# Altium footprint library MARCS Footprints.PcbLib: 53 footprints (part 3 of 4)
Each footprint in its own frame and in the unit in brackets; x right, y up, seen from the top. Pads: shape width x height; smd on the part's side, far side on the other; paste and mask are expansions set on the pad; w line width, h text height; cw(c..) or ccw(c..) is an arc to the next point about the centre after c.
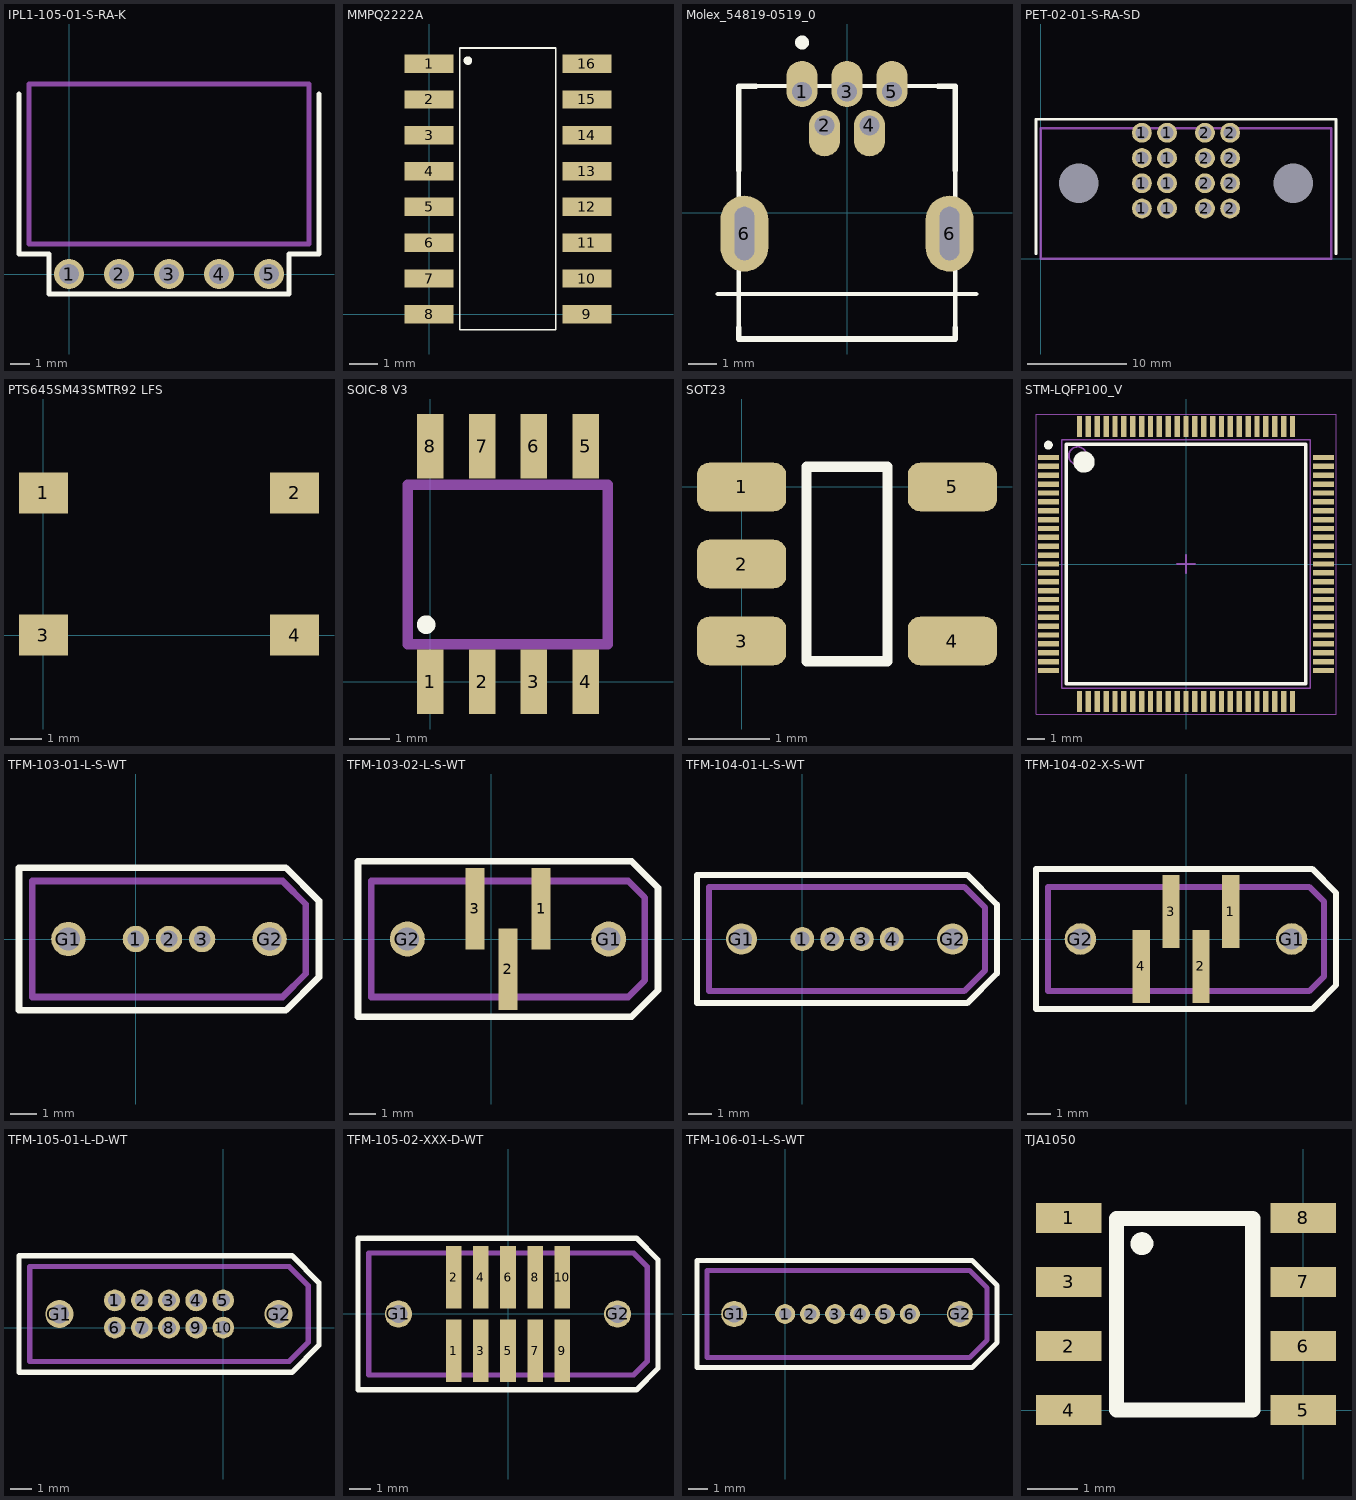
[diagram p2: the footprints below, top view; thin cyan lines are the x and y axes]

## IPL1-105-01-S-RA-K [mil]
pads (5):
  round 60 hole 40 mask+3: 1(0,0) 2(100,0) 3(200,0) 4(300,0) 5(400,0)
Top Overlay:
  lines w10: -100,360 -100,40 -40,40 -40,-40 440,-40 440,40 500,40 500,360
Mechanical 1:
  lines w10: 479,380 -80,380 -80,60 480,60 480,380
3D body "IPL1-105-01-F-S-RA-K.stp": height 277.8, standoff -67.2, extent -79.21,-11.47 480.79,381.03

## MMPQ2222A [mm] "BJT NPN Quad Transistor"
pads (16):
  rect 1.75x0.65 smd: 1(0,8.89) 2(0,7.62) 3(0,6.35) 4(0,5.08) 5(0,3.81) 6(0,2.54) 7(0,1.27) 8(0,0) 9(5.6,0) 10(5.6,1.27) 11(5.6,2.54) 12(5.6,3.81) 13(5.6,5.08) 14(5.6,6.35) 15(5.6,7.62) 16(5.6,8.89)
Top Overlay:
  circle w0.254: c1.375,9 r0.025
  lines w0.064: 1.092,-0.55 4.496,-0.55 4.496,9.45 1.092,9.45 1.092,-0.55
3D body "User Library-SOIC-16-1.SLDPRT": height 1.4, standoff 0, extent -0.2,-0.5 5.8,9.4

## Molex_54819-0519_0 [mm]
pads (7):
  oval 1.1x1.65 hole 0.7 copper offset 0,0.275: 1(-1.6,4.3) 3(0,4.3) 5(1.6,4.3)
  oval 1.1x1.65 hole 0.7 copper offset 0,-0.275: 2(-0.8,3.1) 4(0.8,3.1)
  oval 1.7x2.7 hole 1.9 slot 0.7 at 0 deg paste-1000 mask+0: 6(-3.65,-0.75) 6(3.65,-0.75)
Top Overlay:
  circle w0.25: c-1.6,6.05 r0.125
  lines w0.15: -4.6,-2.9 4.6,-2.9 ; -3.85,-4.5 3.85,-4.5 3.85,4.5 -3.85,4.5 -3.85,-4.5
  lines w0.2: -3.85,-4.1 -3.85,-4.5 3.85,-4.5 3.85,-4.1 ; -3.85,1.5 -3.85,4.5 -3.25,4.5 ; 3.25,4.5 3.85,4.5 3.85,1.5
3D body "3dmodel.step": height 3.98, standoff -1.77, extent -3.85,-4.499 3.85,4.501

## PET-02-01-S-RA-SD [mm]
pads (18):
  round 2 hole 1.32 mask+0.075: 1(10.16,5.08) 1(10.16,7.62) 1(10.16,10.16) 1(10.16,12.7) 1(12.7,5.08) 1(12.7,7.62) 1(12.7,10.16) 1(12.7,12.7) 2(16.51,5.08) 2(16.51,7.62) 2(16.51,10.16) 2(16.51,12.7) 2(19.05,5.08) 2(19.05,7.62) 2(19.05,10.16) 2(19.05,12.7)
  round 0 hole 4.01 unplated: G1(3.81,7.62) G2(25.4,7.62)
Top Overlay:
  lines w0.254: -0.5,0.5 -0.5,14.08 29.7,14.08 ; 29.71,0.5 29.71,14.08
Mechanical 1:
  lines w0.254: 0,0 0,13.14 29.21,13.14 29.21,0 0,0

## PTS645SM43SMTR92 LFS [mm] "SMD Button"
pads (4):
  rect 1.55x1.3 smd: 1(0,4.5) 2(7.95,4.5) 3(0,0) 4(7.95,0)
3D body "PTS645SM43SMTR92LFS.sldprt": height 4.3, standoff 0, extent -0.537,-0.739 8.463,5.261

## SOIC-8 V3 [mm]
pads (8):
  rect 0.65x1.575 smd: 1(0,0) 2(1.27,0) 3(2.54,0) 4(3.81,0) 5(3.81,5.775) 6(2.54,5.775) 7(1.27,5.775) 8(0,5.775)
Top Overlay:
  circle w0.254: c-0.1,1.4 r0.1
Mechanical 1:
  lines w0.254: -0.55,0.925 4.35,0.925 4.35,4.825 -0.55,4.825 -0.55,0.925
3D body "8SIOC.stp": height 1.88, standoff -0.07, extent -0.597,-0.178 4.407,6.02

## SOT23 [mm]
pads (5):
  rrect50% 1.1x0.6 smd: 1(0,0) 2(0,-0.95) 3(0,-1.9) 4(2.6,-1.9) 5(2.6,0)
Top Overlay:
  lines w0.127: 0.8,-2.15 0.8,0.25 1.8,0.25 1.8,-2.15 0.8,-2.15
3D body "DBV0005A.stp": height 1.2, standoff 0, extent -0.1,-2.4 2.7,0.5

## STM-LQFP100_V [mm] "Thin QFP, 100-Leads, Body 14x14mm, Pitch 0.5mm, ST Recommended"
height 1.6
pads (100):
  rect 1.2x0.3 smd: 1(-7.75,6) 2(-7.75,5.5) 3(-7.75,5) 4(-7.75,4.5) 5(-7.75,4) 6(-7.75,3.5) 7(-7.75,3) 8(-7.75,2.5) 9(-7.75,2) 10(-7.75,1.5) 11(-7.75,1) 12(-7.75,0.5) 13(-7.75,0) 14(-7.75,-0.5) 15(-7.75,-1) 16(-7.75,-1.5) 17(-7.75,-2) 18(-7.75,-2.5) 19(-7.75,-3) 20(-7.75,-3.5) 21(-7.75,-4) 22(-7.75,-4.5) 23(-7.75,-5) 24(-7.75,-5.5) 25(-7.75,-6) 51(7.75,-6) 52(7.75,-5.5) 53(7.75,-5) 54(7.75,-4.5) 55(7.75,-4) 56(7.75,-3.5) 57(7.75,-3) 58(7.75,-2.5) 59(7.75,-2) 60(7.75,-1.5) 61(7.75,-1) 62(7.75,-0.5) 63(7.75,0) 64(7.75,0.5) 65(7.75,1) 66(7.75,1.5) 67(7.75,2) 68(7.75,2.5) 69(7.75,3) 70(7.75,3.5) 71(7.75,4) 72(7.75,4.5) 73(7.75,5) 74(7.75,5.5) 75(7.75,6)
  rect 0.3x1.2 smd: 26(-6,-7.75) 27(-5.5,-7.75) 28(-5,-7.75) 29(-4.5,-7.75) 30(-4,-7.75) 31(-3.5,-7.75) 32(-3,-7.75) 33(-2.5,-7.75) 34(-2,-7.75) 35(-1.5,-7.75) 36(-1,-7.75) 37(-0.5,-7.75) 38(0,-7.75) 39(0.5,-7.75) 40(1,-7.75) 41(1.5,-7.75) 42(2,-7.75) 43(2.5,-7.75) 44(3,-7.75) 45(3.5,-7.75) 46(4,-7.75) 47(4.5,-7.75) 48(5,-7.75) 49(5.5,-7.75) 50(6,-7.75) 76(6,7.75) 77(5.5,7.75) 78(5,7.75) 79(4.5,7.75) 80(4,7.75) 81(3.5,7.75) 82(3,7.75) 83(2.5,7.75) 84(2,7.75) 85(1.5,7.75) 86(1,7.75) 87(0.5,7.75) 88(0,7.75) 89(-0.5,7.75) 90(-1,7.75) 91(-1.5,7.75) 92(-2,7.75) 93(-2.5,7.75) 94(-3,7.75) 95(-3.5,7.75) 96(-4,7.75) 97(-4.5,7.75) 98(-5,7.75) 99(-5.5,7.75) 100(-6,7.75)
Top Overlay:
  circle w0.25: c-7.75,6.7 r0.125
  circle w0.6: c-5.75,5.75 r0.3
  lines w0.2: -6.75,-6.75 -6.75,6.75 6.75,6.75 6.75,-6.75 -6.75,-6.75
Mechanical 1:
  circle w0.1: c-6.1,6.1 r0.5
  lines w0.05: -8.45,-8.45 -8.45,8.45 8.45,8.45 8.45,-8.45 -8.45,-8.45
  lines w0.1: -0.5,0 0.5,0 ; 0,-0.5 0,0.5 ; -7,-7 -7,7 7,7 7,-7 -7,-7
3D body: height 1.6, standoff 0.05, extent -7,-7 7,7

## TFM-103-01-L-S-WT [mil]
pads (5):
  round 40 hole 25 mask+3: 1(0,0) 2(50,0) 3(100,0)
  round 52 hole 35 mask+3: G1(-102,0) G2(202,0)
Top Overlay:
  lines w10: -176.5,-107.5 -176.5,107.5 226.5,107.5 276.5,57.5 276.5,-57.5 226.5,-107.5 -176.5,-107.5
Mechanical 1:
  lines w10: -156.5,-87.5 -156.5,87.5 221.5,87.5 256.5,52.5 256.5,-52.5 221.5,-87.5 -156.5,-87.5
3D body "TFM-103-01-L-S-WT.stp": height 220, standoff -93, extent -156.49,-87.5 256.51,87.5

## TFM-103-02-L-S-WT [mil]
pads (5):
  rect 29x123 smd mask+2: 1(75,46) 2(25,-46) 3(-25,46)
  round 53 hole 35 mask+3: G1(177,0) G2(-127,0)
Top Overlay:
  lines w10: -201.5,-117.5 211.5,-117.5 251.5,-77.5 251.5,77.5 211.5,117.5 -201.5,117.5 -201.5,-117.5
Mechanical 1:
  lines w10: -181.5,-87.5 206.5,-87.5 231.5,-62.5 231.5,62.5 206.5,87.5 -181.5,87.5 -181.5,-87.5
  text "J1" at -203,130 h30

## TFM-104-01-L-S-WT [mil]
pads (6):
  round 40 hole 25 mask+3: 1(0,0) 2(50,0) 3(100,0) 4(150,0)
  round 52 hole 35 mask+3: G1(-102,0) G2(252,0)
Top Overlay:
  lines w10: -176.5,-107.5 -176.5,107.5 276.5,107.5 326.5,57.5 326.5,-57.5 276.5,-107.5 -176.5,-107.5
Mechanical 1:
  lines w10: -156.5,-87.5 -156.5,87.5 271.5,87.5 306.5,52.5 306.5,-52.5 271.5,-87.5 -156.5,-87.5
3D body "TFM-104-01-L-S-WT.stp": height 220, standoff -93, extent -156.5,-87.49 306.51,87.51

## TFM-104-02-X-S-WT [mil]
pads (6):
  rect 29x123 smd mask+2: 1(75,46) 2(25,-46) 3(-25,46) 4(-75,-46)
  round 53 hole 35 mask+3: G1(177,0) G2(-177,0)
Top Overlay:
  lines w10: -251.5,-117.5 211.5,-117.5 251.5,-77.5 251.5,77.5 211.5,117.5 -251.5,117.5 -251.5,-117.5
Mechanical 1:
  lines w10: -231.5,-87.5 206.5,-87.5 231.5,-62.5 231.5,62.5 206.5,87.5 -231.5,87.5 -231.5,-87.5
  text "J1" at -19.57,-20 h30

## TFM-105-01-L-D-WT [mil]
pads (12):
  round 40 hole 25 mask+3: 1(-200,50) 2(-150,50) 3(-100,50) 4(-50,50) 5(0,50) 6(-200,0) 7(-150,0) 8(-100,0) 9(-50,0) 10(0,0)
  round 52 hole 35 mask+3: G1(-302,25) G2(102,25)
Top Overlay:
  lines w10: -376.5,-82.5 -376.5,132.5 126.5,132.5 176.5,82.5 176.5,-32.5 126.5,-82.5 -376.5,-82.5
Mechanical 1:
  lines w10: -356.5,-62.5 -356.5,112.5 121.5,112.5 156.5,77.5 156.5,-27.5 121.5,-62.5 -356.5,-62.5
3D body "TFM-105-01-L-D-WT.stp": height 220, standoff -93, extent -356.5,-90 156.5,135

## TFM-105-02-XXX-D-WT [mil]
pads (12):
  rect 29x115 smd mask+2: 1(-100,-67.5) 2(-100,67.5) 3(-50,-67.5) 4(-50,67.5) 5(0,-67.5) 6(0,67.5) 7(50,-67.5) 8(50,67.5) 9(100,-67.5) 10(100,67.5)
  round 50 hole 33 mask+3: G1(-202,0) G2(202,0)
Top Overlay:
  lines w10: -276.5,-140 236.5,-140 276.5,-100 276.5,100 236.5,140 -276.5,140 -276.5,-140
Mechanical 1:
  lines w10: -256.5,-112.5 231.5,-112.5 256.5,-87.5 256.5,87.5 231.5,112.5 -256.5,112.5 -256.5,-112.5
  text "J1" at -19.57,-20 h30

## TFM-106-01-L-S-WT [mil]
pads (8):
  round 40 hole 25 mask+3: 1(0,0) 2(50,0) 3(100,0) 4(150,0) 5(200,0) 6(250,0)
  round 52 hole 35 mask+3: G1(-102,0) G2(350,0)
Top Overlay:
  lines w10: -176.5,-107.5 374.5,-107.5 424.5,-57.5 424.5,57.5 374.5,107.5 -176.5,107.5 -176.5,-107.5
Mechanical 1:
  lines w10: -156.5,-87.5 369.5,-87.5 404.5,-52.5 404.5,52.5 369.5,87.5 -156.5,87.5 -156.5,-87.5
3D body "TFM-106-01-L-S-WT.stp": height 220, standoff -93, extent -156.5,-87.5 406.5,87.5

## TJA1050 [mm] "SOT96"
pads (8):
  rect 1.3x0.6 smd: 1(-4.65,3.81) 2(-4.65,1.27) 3(-4.65,2.54) 4(-4.65,0) 5(0,0) 6(0,1.27) 7(0,2.54) 8(0,3.81)
Top Overlay:
  circle w0.254: c-3.2,3.3 r0.1
  lines w0.3: -3.7,0 -1,0 -1,3.8 -3.7,3.8 -3.7,0
3D body "User Library-so8.SLDPRT": height 1.66, standoff -0.01, extent -5.334,-0.52 0.712,4.38